# Altium footprint library PBL - SMD Packages.PcbLib: 263 footprints (part 8 of 17)
Each footprint in its own frame and in the unit in brackets; x right, y up, seen from the top. Pads: shape width x height; smd on the part's side, far side on the other; paste and mask are expansions set on the pad; w line width, h text height; cw(c..) or ccw(c..) is an arc to the next point about the centre after c.
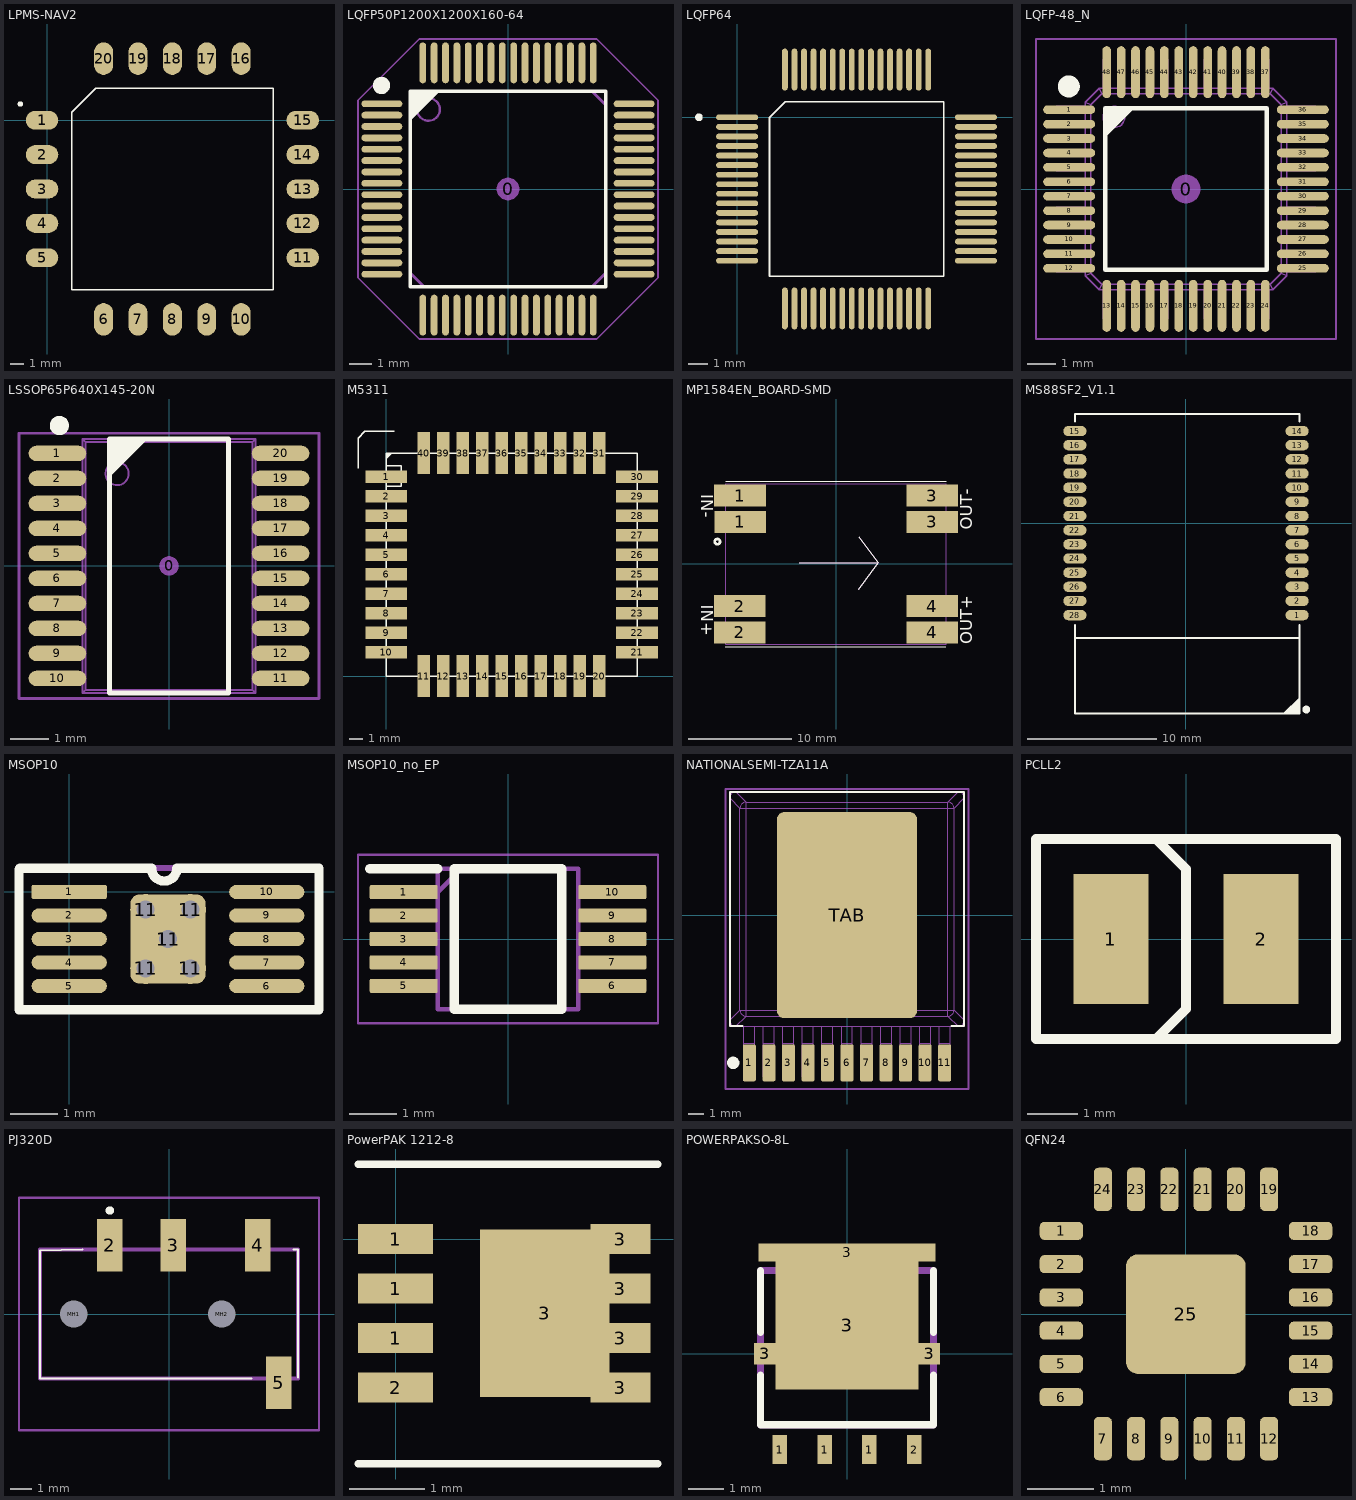
[diagram p7: the footprints below, top view; thin cyan lines are the x and y axes]

## LPMS-NAV2 [mm]
pads (20):
  oval 2.4x1.4 smd: 1(-0.4,0) 2(-0.4,-2.54) 3(-0.4,-5.08) 4(-0.4,-7.62) 5(-0.4,-10.16) 11(18.86,-10.16) 12(18.86,-7.62) 13(18.86,-5.08) 14(18.86,-2.54) 15(18.86,0)
  oval 1.4x2.4 smd: 6(4.15,-14.71) 7(6.69,-14.71) 8(9.23,-14.71) 9(11.77,-14.71) 10(14.31,-14.71) 16(14.31,4.55) 17(11.77,4.55) 18(9.23,4.55) 19(6.69,4.55) 20(4.15,4.55)
Top Overlay:
  circle w0.2: c-2,1.2 r0.1
  lines w0.1: 1.785,-12.525 1.785,0.58 3.57,2.365 16.675,2.365 16.675,-12.525 1.785,-12.525
3D body: height 3.7, standoff 0.1, extent -0.8,-15.2 19.52,5.12

## LQFP50P1200X1200X160-64 [mm] "Thin Quad Flat Pack, 64 pins, 0.5mm pitch, 12mm lead span, body 10x10mm, 0.1mm body height, max tolerances, IPC Medium Density"
height 1.6
pads (65):
  round 1 on Mech15: 0(0,0)
  oval 1.8x0.3 smd: 1(-5.55,3.75) 2(-5.55,3.25) 3(-5.55,2.75) 4(-5.55,2.25) 5(-5.55,1.75) 6(-5.55,1.25) 7(-5.55,0.75) 8(-5.55,0.25) 9(-5.55,-0.25) 10(-5.55,-0.75) 11(-5.55,-1.25) 12(-5.55,-1.75) 13(-5.55,-2.25) 14(-5.55,-2.75) 15(-5.55,-3.25) 16(-5.55,-3.75) 33(5.55,-3.75) 34(5.55,-3.25) 35(5.55,-2.75) 36(5.55,-2.25) 37(5.55,-1.75) 38(5.55,-1.25) 39(5.55,-0.75) 40(5.55,-0.25) 41(5.55,0.25) 42(5.55,0.75) 43(5.55,1.25) 44(5.55,1.75) 45(5.55,2.25) 46(5.55,2.75) 47(5.55,3.25) 48(5.55,3.75)
  oval 0.3x1.8 smd: 17(-3.75,-5.55) 18(-3.25,-5.55) 19(-2.75,-5.55) 20(-2.25,-5.55) 21(-1.75,-5.55) 22(-1.25,-5.55) 23(-0.75,-5.55) 24(-0.25,-5.55) 25(0.25,-5.55) 26(0.75,-5.55) 27(1.25,-5.55) 28(1.75,-5.55) 29(2.25,-5.55) 30(2.75,-5.55) 31(3.25,-5.55) 32(3.75,-5.55) 49(3.75,5.55) 50(3.25,5.55) 51(2.75,5.55) 52(2.25,5.55) 53(1.75,5.55) 54(1.25,5.55) 55(0.75,5.55) 56(0.25,5.55) 57(-0.25,5.55) 58(-0.75,5.55) 59(-1.25,5.55) 60(-1.75,5.55) 61(-2.25,5.55) 62(-2.75,5.55) 63(-3.25,5.55) 64(-3.75,5.55)
Top Overlay:
  circle w0.381: c-5.564,4.556 r0.191
  region: -4.294,4.294 -3.006,4.294 -4.294,3.006
  lines w0.152: -4.3,-4.3 -4.3,4.3 4.3,4.3 4.3,-4.3 -4.3,-4.3
13 - 3D Top Side:
  circle w0.1: c-3.5,3.5 r0.5
  lines w0.127: -4.3,-3.7 -4.3,3.7 -3.7,4.3 3.7,4.3 4.3,3.7 4.3,-3.7 3.7,-4.3 -3.7,-4.3 -4.3,-3.7
15 - Top Courtyards:
  lines w0.076: -6.6,-3.9 -6.6,3.9 -3.9,6.6 3.9,6.6 6.6,3.9 6.6,-3.9 3.9,-6.6 -3.9,-6.6 -6.6,-3.9
3D body "LQFP50P1200X1200X160-64.STEP": height 1.59, standoff -0.01, extent -6.1,-6.1 6.1,6.1

## LQFP64 [mm]
pads (64):
  oval 2.2x0.3 smd: 1(0,0) 2(0,-0.5) 3(0,-1) 4(0,-1.5) 5(0,-2) 6(0,-2.5) 7(0,-3) 8(0,-3.5) 9(0,-4) 10(0,-4.5) 11(0,-5) 12(0,-5.5) 13(0,-6) 14(0,-6.5) 15(0,-7) 16(0,-7.5) 33(12.5,-7.5) 34(12.5,-7) 35(12.5,-6.5) 36(12.5,-6) 37(12.5,-5.5) 38(12.5,-5) 39(12.5,-4.5) 40(12.5,-4) 41(12.5,-3.5) 42(12.5,-3) 43(12.5,-2.5) 44(12.5,-2) 45(12.5,-1.5) 46(12.5,-1) 47(12.5,-0.5) 48(12.5,0)
  oval 0.3x2.2 smd: 17(2.5,-10) 18(3,-10) 19(3.5,-10) 20(4,-10) 21(4.5,-10) 22(5,-10) 23(5.5,-10) 24(6,-10) 25(6.5,-10) 26(7,-10) 27(7.5,-10) 28(8,-10) 29(8.5,-10) 30(9,-10) 31(9.5,-10) 32(10,-10) 49(10,2.5) 50(9.5,2.5) 51(9,2.5) 52(8.5,2.5) 53(8,2.5) 54(7.5,2.5) 55(7,2.5) 56(6.5,2.5) 57(6,2.5) 58(5.5,2.5) 59(5,2.5) 60(4.5,2.5) 61(4,2.5) 62(3.5,2.5) 63(3,2.5) 64(2.5,2.5)
Top Overlay:
  circle w0.2: c-2,0 r0.1
  lines w0.1: 1.685,-8.315 1.685,-0.015 2.515,0.815 10.815,0.815 10.815,-8.315 1.685,-8.315
3D body "LQFP64 v1.step": height 1.6, standoff 0.02, extent 0.2,-9.8 12.338,2.338

## LQFP-48_N [mm] "Thin QFP, 48-Leads, Body 7x7mm, Pitch 0.5mm, IPC Medium Density"
height 1.6
pads (49):
  round 1 on Mech15: 0(0,0)
  oval 1.8x0.3 smd: 1(-4.05,2.75) 2(-4.05,2.25) 3(-4.05,1.75) 4(-4.05,1.25) 5(-4.05,0.75) 6(-4.05,0.25) 7(-4.05,-0.25) 8(-4.05,-0.75) 9(-4.05,-1.25) 10(-4.05,-1.75) 11(-4.05,-2.25) 12(-4.05,-2.75) 25(4.05,-2.75) 26(4.05,-2.25) 27(4.05,-1.75) 28(4.05,-1.25) 29(4.05,-0.75) 30(4.05,-0.25) 31(4.05,0.25) 32(4.05,0.75) 33(4.05,1.25) 34(4.05,1.75) 35(4.05,2.25) 36(4.05,2.75)
  oval 0.3x1.8 smd: 13(-2.75,-4.05) 14(-2.25,-4.05) 15(-1.75,-4.05) 16(-1.25,-4.05) 17(-0.75,-4.05) 18(-0.25,-4.05) 19(0.25,-4.05) 20(0.75,-4.05) 21(1.25,-4.05) 22(1.75,-4.05) 23(2.25,-4.05) 24(2.75,-4.05) 37(2.75,4.05) 38(2.25,4.05) 39(1.75,4.05) 40(1.25,4.05) 41(0.75,4.05) 42(0.25,4.05) 43(-0.25,4.05) 44(-0.75,4.05) 45(-1.25,4.05) 46(-1.75,4.05) 47(-2.25,4.05) 48(-2.75,4.05)
Top Overlay:
  circle w0.381: c-4.064,3.556 r0.191
  region: -2.794,2.794 -1.794,2.794 -2.794,1.794
  lines w0.152: -2.794,-2.794 2.794,-2.794 2.794,2.794 -2.794,2.794 -2.794,-2.794
13 - 3D Top Side:
  drawing of 361 lines, arcs and shapes, not listed
15 - Top Courtyards:
  lines w0.076: -5.2,-5.2 5.2,-5.2 5.2,5.2 -5.2,5.2 -5.2,-5.2
3D body "LQFP-48.STEP": height 1.59, standoff -0.01, extent -4.5,-4.5 4.5,4.5

## LSSOP65P640X145-20N [mm] "LSSOP, 20-Leads, Body 6.6x4.5mm (max), Pitch 0.65mm, IPC Medium Density"
height 1.45
pads (21):
  round 0.508 on Mech15 mask+0.127: 0(0,0)
  oval 1.5x0.4 smd paste-1 mask+0.127: 1(-2.9,2.925) 2(-2.9,2.275) 3(-2.9,1.625) 4(-2.9,0.975) 5(-2.9,0.325) 6(-2.9,-0.325) 7(-2.9,-0.975) 8(-2.9,-1.625) 9(-2.9,-2.275) 10(-2.9,-2.925) 11(2.9,-2.925) 12(2.9,-2.275) 13(2.9,-1.625) 14(2.9,-0.975) 15(2.9,-0.325) 16(2.9,0.325) 17(2.9,0.975) 18(2.9,1.625) 19(2.9,2.275) 20(2.9,2.925)
Top Overlay:
  circle w0.25: c-2.85,3.65 r0.125
  region: -1.55,3.3 -0.55,3.3 -1.55,2.3
  lines w0.127: -1.55,-3.3 1.55,-3.3 1.55,3.3 -1.55,3.3 -1.55,-3.3
Top Paste:
  region: 3.5,-2.775 2.3,-2.775 2.3,-3.075 3.5,-3.075
  region: 3.5,-2.125 2.3,-2.125 2.3,-2.425 3.5,-2.425
  region: 3.5,-1.475 2.3,-1.475 2.3,-1.775 3.5,-1.775
  rectangle: -3.5,-1.775 -2.3,-1.475
  rectangle: -3.5,-2.425 -2.3,-2.125
  rectangle: -3.5,-3.075 -2.3,-2.775
  rectangle: -3.5,-1.125 -2.3,-0.825
  rectangle: -3.5,-0.475 -2.3,-0.175
  rectangle: -3.5,0.175 -2.3,0.475
  rectangle: -3.5,0.825 -2.3,1.125
  rectangle: -3.5,1.475 -2.3,1.775
  rectangle: -3.5,2.125 -2.3,2.425
  rectangle: -3.5,2.775 -2.3,3.075
  region: 3.5,3.075 2.3,3.075 2.3,2.775 3.5,2.775
  region: 3.5,2.425 2.3,2.425 2.3,2.125 3.5,2.125
  region: 3.5,1.775 2.3,1.775 2.3,1.475 3.5,1.475
  region: 3.5,1.125 2.3,1.125 2.3,0.825 3.5,0.825
  region: 3.5,0.475 2.3,0.475 2.3,0.175 3.5,0.175
  region: 3.5,-0.175 2.3,-0.175 2.3,-0.475 3.5,-0.475
  region: 3.5,-0.825 2.3,-0.825 2.3,-1.125 3.5,-1.125
13 - 3D Top Side:
  drawing of 153 lines, arcs and shapes, not listed
15 - Top Courtyards:
  lines w0.076: -3.9,-3.45 3.9,-3.45 3.9,3.45 -3.9,3.45 -3.9,-3.45
3D body "LSSOP65P640X145-20N.STEP": height 1.45, standoff 0, extent -3.3,-3.3 3.3,3.3

## M5311 [mm]
height 2.5
pads (40):
  rect 3x0.9 smd: 1(0,14.302) 2(0,12.902) 3(0,11.502) 4(0,10.102) 5(0,8.702) 6(0,7.302) 7(0,5.902) 8(0,4.502) 9(0,3.102) 10(0,1.702) 21(18,1.702) 22(18,3.102) 23(18,4.502) 24(18,5.902) 25(18,7.302) 26(18,8.702) 27(18,10.102) 28(18,11.502) 29(18,12.902) 30(18,14.302)
  rect 0.9x3 smd: 11(2.7,0.002) 12(4.1,0.002) 13(5.5,0.002) 14(6.9,0.002) 15(8.3,0.002) 16(9.7,0.002) 17(11.1,0.002) 18(12.5,0.002) 19(13.9,0.002) 20(15.3,0.002) 31(15.3,16.002) 32(13.9,16.002) 33(12.5,16.002) 34(11.1,16.002) 35(9.7,16.002) 36(8.3,16.002) 37(6.9,16.002) 38(5.5,16.002) 39(4.1,16.002) 40(2.7,16.002)
Top Overlay:
  lines w0.1: -2.02,14.911 -2.02,17.077 -1.52,17.577 0.566,17.577 ; 0.01,15.897 0.103,15.99 0.165,15.99 0.012,15.837 0.012,15.775 0.222,15.985 0.264,15.985 0.013,15.734 0.013,15.701 0.3,15.987 0.346,15.987 0.019,15.659 0.019,15.627 0.374,15.982 ; 0,0.002 0,16.002 18,16.002 18,0.002 0,0.002 ; 0,13.605 0,15.091 1.082,15.091 1.082,13.605 0,13.605

## MP1584EN_BOARD-SMD [mm]
pads (8):
  rect 5x2.1 smd: 1(-9.265,6.6) 1(-9.252,4.06) 2(-9.29,-6.608) 2(-9.29,-4.068) 3(9.277,4.06) 3(9.277,6.6) 4(9.277,-6.608) 4(9.277,-4.068)
Top Overlay:
  circle w0.254: c-11.449,2.155 r0.254
  lines w0.12: -10.687,-8.005 10.586,-8.005 ; -10.623,7.997 10.649,7.997 ; -3.55,0.097 4.07,0.097 ; 2.165,-2.443 4.07,0.097 ; 2.165,2.637 4.07,0.097
  text "OUT-" at 13.529,3.306 h2
  text "IN-" at -13.422,6.712 h2
  text "OUT+" at 13.523,-7.744 h2
  text "IN+" at -13.415,-3.939 h2
04 - Sheet:
  lines w0.12: -10.623,-7.726 10.649,-7.726 10.649,7.717 -10.623,7.717 -10.623,-7.726
Top 3D Body:
  lines w0.12: -3.55,0.097 4.07,0.097 ; 2.165,-2.443 4.07,0.097 ; 2.165,2.637 4.07,0.097
  text "IN-" at -13.422,6.712 h2
  text "OUT+" at 13.523,-7.744 h2
  text "IN+" at -13.415,-3.939 h2
  text "OUT-" at 13.529,3.306 h2
3D body: height 1, standoff 0.1, extent -10.505,-7.547 10.704,7.947

## MS88SF2_V1.1 [mm]
pads (28):
  oval 1.8x0.8 smd: 1(8.601,-7.125) 2(8.601,-6.029) 3(8.601,-4.933) 4(8.601,-3.837) 5(8.601,-2.741) 6(8.601,-1.645) 7(8.601,-0.549) 8(8.601,0.547) 9(8.601,1.643) 10(8.601,2.739) 11(8.601,3.835) 12(8.601,4.931) 13(8.601,6.027) 14(8.601,7.123) 15(-8.599,7.123) 16(-8.599,6.027) 17(-8.599,4.931) 18(-8.599,3.835) 19(-8.599,2.739) 20(-8.599,1.643) 21(-8.599,0.547) 22(-8.599,-0.549) 23(-8.599,-1.645) 24(-8.599,-2.741) 25(-8.599,-3.837) 26(-8.599,-4.933) 27(-8.599,-6.029) 28(-8.599,-7.125)
Top Overlay:
  circle w0.3: c9.311,-14.435 r0.15
  region: 8.806,-14 8.806,-14.78 8.771,-14.78 8.746,-14.78 7.506,-14.78 8.806,-13.48
  lines w0.16: -8.598,-8.903 8.801,-8.903 ; -8.598,-7.887 -8.598,-14.745 8.801,-14.745 8.801,-7.887 ; -8.598,7.861 -8.598,8.433 ; -8.598,8.443 8.801,8.443 8.801,7.861
3D body "MS88SF2_PCB_V1.1.step": height 2.1, standoff 0.01, extent -8.598,-14.75 8.8,8.445

## MSOP10 [mm]
pads (16):
  rrect25% 1.6x0.3 smd mask+0.05: 1(0,0)
  oval 1.6x0.3 smd mask+0.05: 2(0,-0.5) 3(0,-1) 4(0,-1.5) 5(0,-2) 6(4.2,-2) 7(4.2,-1.5) 8(4.2,-1) 9(4.2,-0.5) 10(4.2,0)
  round 0.66 hole 0.381: 11(1.625,-1.625) 11(1.625,-0.375) 11(2.1,-1) 11(2.575,-1.625) 11(2.575,-0.375)
  rrect25% 1.6x1.9 smd: 11(2.1,-1)
Top Overlay:
  lines w0.2: 1.725,0.5 -1.049,0.5 -1.067,0.483 -1.067,-2.5 5.309,-2.5 5.309,0.5 2.3,0.5 ; 1.75,0.5 ccw(c2.019,0.5) 2.289,0.5
Top Solder:
  rectangle: 1.175,-2.075 3.025,0.075
15 - Top Courtyards:
  lines w0.127: -1.067,-2.489 -1.067,0.508 5.309,0.508 5.309,-2.489 -1.067,-2.489
3D body: height 0.15, standoff 0, extent -0.375,-2.125 4.6,0.125
3D body: height 1.1, standoff 0, extent 0.625,-2.5 3.625,0.525

## MSOP10_no_EP [mm] "MSOP10 package"
pads (10):
  rrect20% 1.45x0.3 smd mask+0.05: 1(-2.225,1) 2(-2.225,0.5) 3(-2.225,0) 4(-2.225,-0.5) 5(-2.225,-1) 6(2.225,-1) 7(2.225,-0.5) 8(2.225,0) 9(2.225,0.5) 10(2.225,1)
Top Overlay:
  lines w0.2: -2.95,1.5 -1.5,1.5 ; -1.15,-1.5 -1.15,1.5 1.15,1.5 1.15,-1.5 -1.15,-1.5
13 - 3D Top Side:
  lines w0.1: -1.5,1 -1,1.5 ; -1.5,-1.5 -1.5,1.5 1.5,1.5 1.5,-1.5 -1.5,-1.5
15 - Top Courtyards:
  lines w0.05: -3.2,-1.8 -3.2,1.8 3.2,1.8 3.2,-1.8 -3.2,-1.8
3D body "AD5314ARMZ.stp": height 1.1, standoff 0, extent -2.45,-1.5 2.45,1.5

## NATIONALSEMI-TZA11A [mm] "National Semi TZA11A package"
height 6
pads (12):
  rrect25% 0.85x2.4 smd: 1(-6.35,-9.6) 2(-5.08,-9.6) 3(-3.81,-9.6) 4(-2.54,-9.6) 5(-1.27,-9.6) 6(0,-9.6) 7(1.27,-9.6) 8(2.54,-9.6) 9(3.81,-9.6) 10(5.08,-9.6) 11(6.35,-9.6)
  rrect10% 9.1x13.4 smd: TAB(0,0)
Top Overlay:
  circle w0.4: c-7.4,-9.6 r0.2
  lines w0.127: -6.8,-7.2 -7.6,-7.2 -7.6,8 7.6,8 7.6,-7.2 6.8,-7.2
13 - 3D Top Side:
  lines w0.05: -6.705,-9.644 -5.995,-9.644 ; -6.705,-9.29 -5.995,-9.29 ; -6.705,-8.865 -5.995,-8.865 ; -6.705,-8.325 -5.995,-8.325 ; -6.705,-7.235 -6.705,-10.515 -5.995,-10.515 -5.995,-7.235 ; -5.435,-9.644 -4.725,-9.644 ; -5.435,-9.29 -4.725,-9.29 ; -5.435,-8.865 -4.725,-8.865 ; -5.435,-8.325 -4.725,-8.325 ; -5.435,-7.235 -5.435,-10.515 -4.725,-10.515 -4.725,-7.235 ; -4.165,-9.644 -3.455,-9.644 ; -4.165,-9.29 -3.455,-9.29 ; -4.165,-8.865 -3.455,-8.865 ; -4.165,-8.325 -3.455,-8.325 ; -4.165,-7.235 -4.165,-10.515 -3.455,-10.515 -3.455,-7.235 ; -2.895,-9.644 -2.185,-9.644 ; -2.895,-9.29 -2.185,-9.29 ; -2.895,-8.865 -2.185,-8.865 ; -2.895,-8.325 -2.185,-8.325 ; -2.895,-7.235 -2.895,-10.515 -2.185,-10.515 -2.185,-7.235 ; -1.625,-9.644 -0.915,-9.644 ; -1.625,-9.29 -0.915,-9.29 ; -1.625,-8.865 -0.915,-8.865 ; -1.625,-8.325 -0.915,-8.325 ; -1.625,-7.235 -1.625,-10.515 -0.915,-10.515 -0.915,-7.235 ; -0.355,-9.644 0.355,-9.644 ; -0.355,-9.29 0.355,-9.29 ; -0.355,-8.865 0.355,-8.865 ; -0.355,-8.325 0.355,-8.325 ; -0.355,-7.235 -0.355,-10.515 0.355,-10.515 0.355,-7.235 ; 0.915,-9.644 1.625,-9.644 ; 0.915,-9.29 1.625,-9.29 ; 0.915,-8.865 1.625,-8.865 ; 0.915,-8.325 1.625,-8.325 ; 0.915,-7.235 0.915,-10.515 1.625,-10.515 1.625,-7.235 ; 2.185,-9.644 2.895,-9.644 ; 2.185,-9.29 2.895,-9.29 ; 2.185,-8.865 2.895,-8.865 ; 2.185,-8.325 2.895,-8.325 ; 2.185,-7.235 2.185,-10.515 2.895,-10.515 2.895,-7.235 ; 3.455,-9.644 4.165,-9.644 ; 3.455,-9.29 4.165,-9.29 ; 3.455,-8.865 4.165,-8.865 ; 3.455,-8.325 4.165,-8.325 ; 3.455,-7.235 3.455,-10.515 4.165,-10.515 4.165,-7.235 ; 4.725,-9.644 5.435,-9.644 ; 4.725,-9.29 5.435,-9.29 ; 4.725,-8.865 5.435,-8.865 ; 4.725,-8.325 5.435,-8.325 ; 4.725,-7.235 4.725,-10.515 5.435,-10.515 5.435,-7.235 ; 5.995,-9.644 6.705,-9.644 ; 5.995,-9.29 6.705,-9.29 ; 5.995,-8.865 6.705,-8.865 ; 5.995,-8.325 6.705,-8.325 ; 5.995,-7.235 5.995,-10.515 6.705,-10.515 6.705,-7.235 ; -7.625,-6.839 ccw(c-7.225,-6.835) -7.229,-7.235 ; -7.625,-6.839 -7.625,-6.835 -7.625,7.615 -7.625,7.619 ; -7.625,-6.839 -6.958,-6.172 ; -7.625,7.619 cw(c-7.225,7.615) -7.229,8.015 ; -7.625,7.619 -6.958,6.952 ; -7.229,-7.235 -7.225,-7.235 7.225,-7.235 7.229,-7.235 ; -7.229,-7.235 -6.562,-6.568 ; -7.229,8.015 -7.225,8.015 7.225,8.015 7.229,8.015 ; -7.229,8.015 -6.562,7.348 ; -6.958,-6.172 ccw(c-6.553,-6.163) -6.562,-6.568 ; -6.958,-6.172 -6.958,6.952 ; -6.958,-6.172 6.958,-6.172 ; -6.958,6.952 cw(c-6.553,6.943) -6.562,7.348 ; -6.958,6.952 6.958,6.952 ; -6.562,-6.568 -6.562,7.348 ; -6.562,-6.568 6.562,-6.568 ; -6.562,7.348 6.562,7.348 ; 6.562,-6.568 ccw(c6.553,-6.163) 6.958,-6.172 ; 6.562,-6.568 7.229,-7.235 ; 6.562,-6.568 6.562,7.348 ; 6.562,7.348 cw(c6.553,6.943) 6.958,6.952 ; 6.562,7.348 7.229,8.015 ; 6.958,-6.172 7.625,-6.839 ; 6.958,-6.172 6.958,6.952 ; 6.958,6.952 7.625,7.619 ; 7.229,-7.235 ccw(c7.225,-6.835) 7.625,-6.839 ; 7.229,8.015 cw(c7.225,7.615) 7.625,7.619 ; 7.625,-6.839 7.625,-6.835 7.625,7.615 7.625,7.619
15 - Top Courtyards:
  lines w0.127: -7.9,-11.3 -7.9,8.2 7.9,8.2 7.9,-11.3 -7.9,-11.3
3D body "NATIONALSEMI-TZA11A.STEP": height 6, standoff 0, extent -7.625,-10.515 7.625,8.015

## PCLL2 [mm]
pads (2):
  rect 1.5x2.6 smd: 1(-1.5,0) 2(1.5,0)
Top Overlay:
  lines w0.2: -0.6,-2 0,-1.4 0,1.4 -0.6,2 ; -3,-2 3,-2 3,2 -3,2 -3,-1.45 -3,-2

## PJ320D [mm]
pads (6):
  rect 1.2x2.5 smd: 2(-2.8,3.25) 3(0.2,3.25) 4(4.2,3.25) 5(5.2,-3.25)
  round 0.65 hole 1.3 unplated: MH1(-4.5,0) MH2(2.5,0)
Top Overlay:
  lines w0.1: -4.1,3.05 -6.1,3 -6.1,-3 -6.1,-3.05 3.9,-3.05 ; 5.9,3.05 6.1,3.05 6.1,-3
  lines w0.2: -2.9,4.9 cw(c-2.8,4.9) -2.7,4.9 cw(c-2.8,4.9) -2.9,4.9
13 - 3D Top Side:
  lines w0.2: -6.1,-3.05 6.1,-3.05 6.1,3.05 -6.1,3.05 -6.1,-3.05
15 - Top Courtyards:
  lines w0.1: -7.1,-5.5 7.1,-5.5 7.1,5.5 -7.1,5.5 -7.1,-5.5
3D body "pj-320d-y.stp": height 5.1, standoff -0.4, extent -8,-4 6,4

## PowerPAK 1212-8 [mm] "PowerPak SO-8"
pads (9):
  rect 1x0.4 smd mask+0.102: 1(0,-1.32) 1(0,-0.66) 1(0,0) 2(0,-1.98)
  rect 1.725x2.235 smd mask+0.102: 3(1.99,-0.99)
  rect 0.8x0.4 smd mask+0.102: 3(3,-1.98) 3(3,-1.32) 3(3,-0.66) 3(3,0)
Top Overlay:
  lines w0.1: -0.5,-3 3.5,-3 ; -0.5,1 3.5,1
3D body "PowerPAK 1212-8 Single Pad.step": height 1.06, standoff 0.02, extent -0.275,-2.775 3.275,0.775

## POWERPAKSO-8L [mm]
pads (8):
  rect 0.41x0.82 smd: 1(-1.905,-2.715) 1(-0.635,-2.715) 1(0.635,-2.715) 2(1.905,-2.715)
  rect 0.595x0.61 smd: 3(-2.328,0) 3(2.328,0)
  rect 4.061x3.63 smd: 3(0,0.801)
  rect 5x0.51 smd: 3(0,2.866)
Top Overlay:
  lines w0.2: -2.45,-0.6 -2.45,-2.015 2.45,-2.015 2.45,-0.6 ; -2.45,0.6 -2.45,2.355 ; 2.45,0.6 2.45,2.355
13 - 3D Top Side:
  lines w0.2: -2.45,-2.015 2.45,-2.015 2.45,2.355 -2.45,2.355 -2.45,-2.015

## QFN24 [mm] "QFN, 24-Leads with exposed die pad, Body 4x4mm), Pitch 0.50mm"
pads (25):
  rrect50% 0.65x0.27 smd mask+0.05: 1(-1.874,1.252) 2(-1.874,0.752) 3(-1.874,0.252) 4(-1.874,-0.248) 5(-1.874,-0.748) 6(-1.874,-1.248) 13(1.876,-1.248) 14(1.876,-0.748) 15(1.876,-0.248) 16(1.876,0.252) 17(1.876,0.752) 18(1.876,1.252)
  rrect50% 0.27x0.65 smd mask+0.05: 7(-1.249,-1.873) 8(-0.749,-1.873) 9(-0.249,-1.873) 10(0.251,-1.873) 11(0.751,-1.873) 12(1.251,-1.873) 19(1.251,1.877) 20(0.751,1.877) 21(0.251,1.877) 22(-0.249,1.877) 23(-0.749,1.877) 24(-1.249,1.877)
  rrect20% 1.8x1.8 smd mask+0.05: 25(0,0)
3D body: height 0.8, standoff 0.1, extent -2,-2 2,2